# Altium footprint library Package_DFN_QFN.PcbLib: 557 footprints (part 10 of 35)
Each footprint in its own frame and in the unit in brackets; x right, y up, seen from the top. Pads: shape width x height; smd on the part's side, far side on the other; paste and mask are expansions set on the pad; w line width, h text height; cw(c..) or ccw(c..) is an arc to the next point about the centre after c.
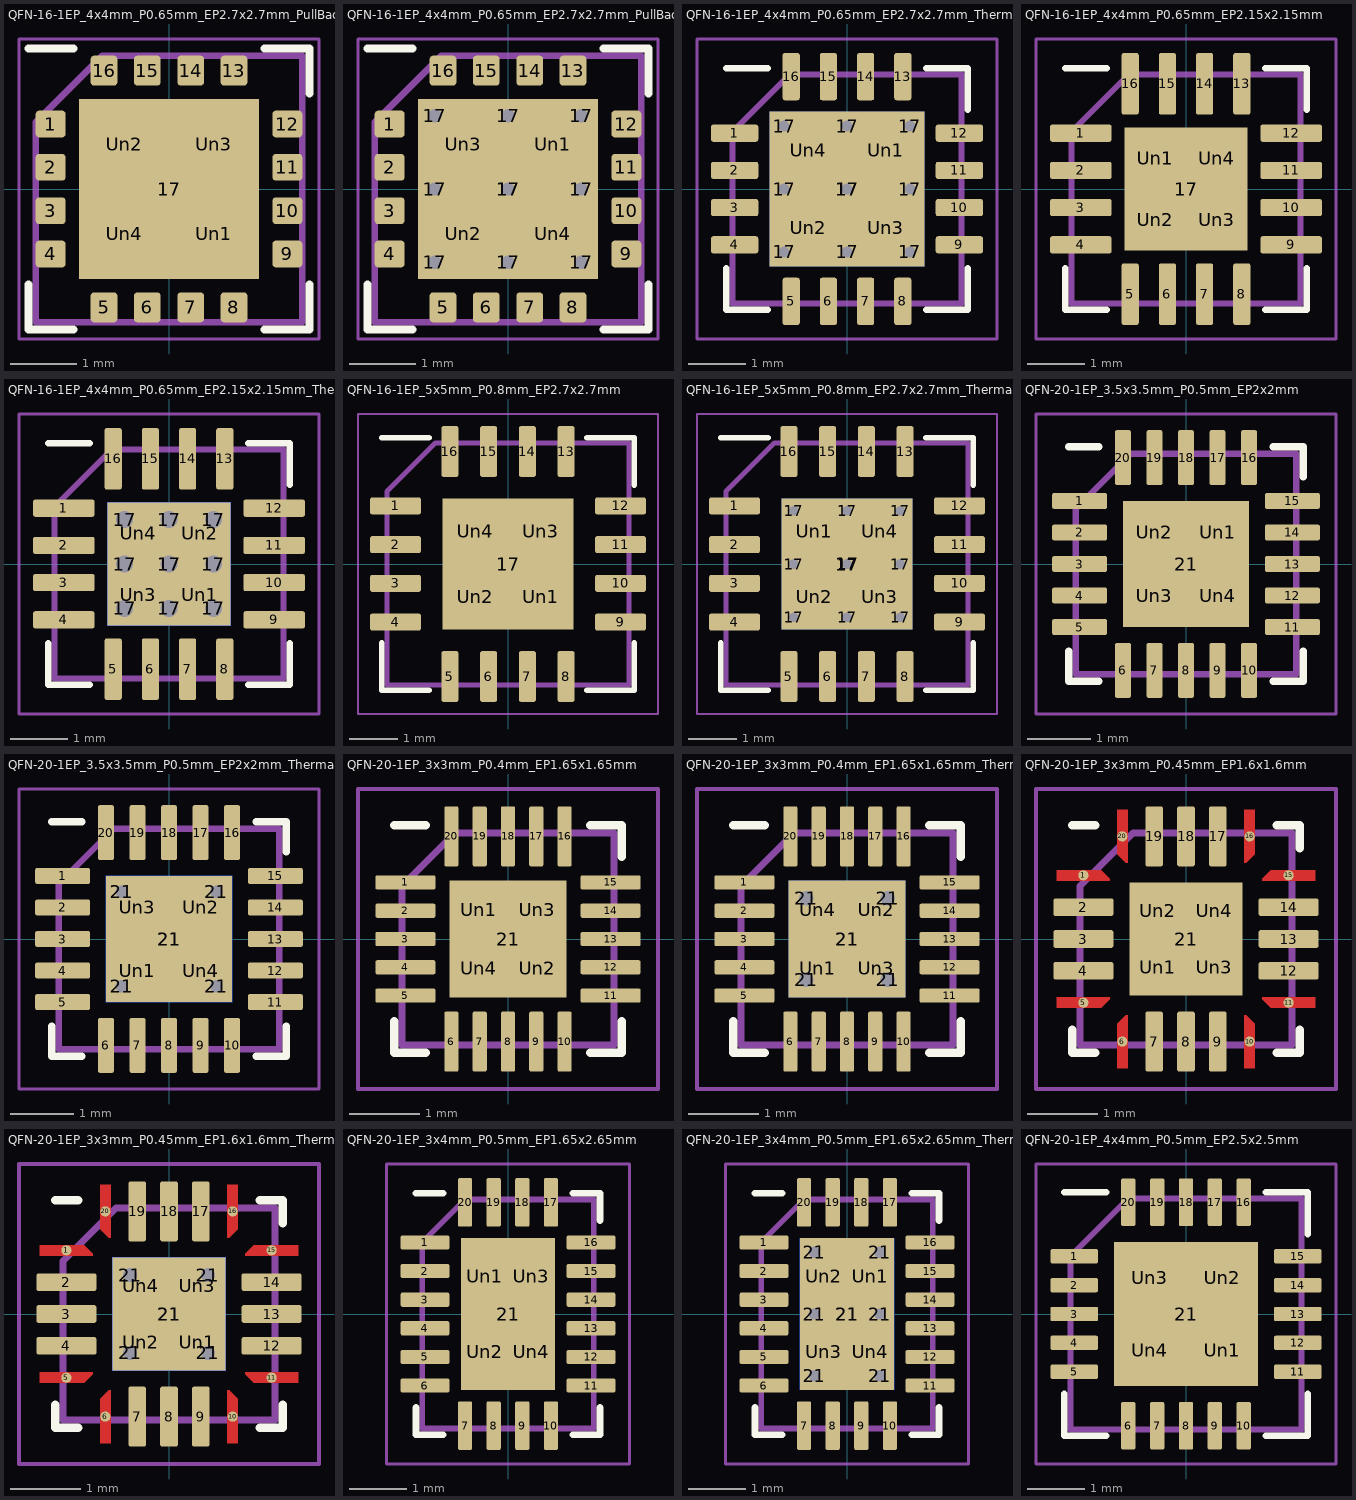
[diagram p9: the footprints below, top view; thin cyan lines are the x and y axes]

## QFN-16-1EP_4x4mm_P0.65mm_EP2.7x2.7mm_PullBack [mm]
pads (21):
  rrect25% 0.45x0.4 smd: 1(-1.775,0.975) 2(-1.775,0.325) 3(-1.775,-0.325) 4(-1.775,-0.975) 9(1.775,-0.975) 10(1.775,-0.325) 11(1.775,0.325) 12(1.775,0.975)
  rrect25% 0.4x0.45 smd: 5(-0.975,-1.775) 6(-0.325,-1.775) 7(0.325,-1.775) 8(0.975,-1.775) 13(0.975,1.775) 14(0.325,1.775) 15(-0.325,1.775) 16(-0.975,1.775)
  rect 2.7x2.7 smd: 17(0,0)
  rrect23% 1.09x1.09 on Top Paste: Un1(0.675,-0.675) Un2(-0.675,0.675) Un3(0.675,0.675) Un4(-0.675,-0.675)
F.SilkS:
  lines w0.12: -2.11,-1.435 -2.11,-2.11 -1.435,-2.11 ; -2.11,2.11 -1.435,2.11 ; 1.435,-2.11 2.11,-2.11 2.11,-1.435 ; 1.435,2.11 2.11,2.11 2.11,1.435
F.CrtYd:
  lines w0.05: -2.25,-2.25 2.25,-2.25 2.25,2.25 -2.25,2.25 -2.25,-2.25
F.Fab:
  lines w0.1: -2,-2 -2,1 -1,2 2,2 2,-2 -2,-2
  text "'.Designator'" at -4.047,-0.84 h1

## QFN-16-1EP_4x4mm_P0.65mm_EP2.7x2.7mm_PullBack_ThermalVias [mm]
pads (31):
  rrect25% 0.45x0.4 smd: 1(-1.775,0.975) 2(-1.775,0.325) 3(-1.775,-0.325) 4(-1.775,-0.975) 9(1.775,-0.975) 10(1.775,-0.325) 11(1.775,0.325) 12(1.775,0.975)
  rrect25% 0.4x0.45 smd: 5(-0.975,-1.775) 6(-0.325,-1.775) 7(0.325,-1.775) 8(0.975,-1.775) 13(0.975,1.775) 14(0.325,1.775) 15(-0.325,1.775) 16(-0.975,1.775)
  round 0.5 hole 0.2: 17(-1.1,-1.1) 17(-1.1,0) 17(-1.1,1.1) 17(0,-1.1) 17(0,0) 17(0,1.1) 17(1.1,-1.1) 17(1.1,0) 17(1.1,1.1)
  rect 2.7x2.7 smd far side: 17(0,0)
  rect 2.7x2.7 smd: 17(0,0)
  rrect21% 1.17x1.17 on Top Paste: Un1(0.675,0.675) Un2(-0.675,-0.675) Un3(-0.675,0.675) Un4(0.675,-0.675)
F.SilkS:
  lines w0.12: -2.11,-1.435 -2.11,-2.11 -1.435,-2.11 ; -2.11,2.11 -1.435,2.11 ; 1.435,-2.11 2.11,-2.11 2.11,-1.435 ; 1.435,2.11 2.11,2.11 2.11,1.435
F.CrtYd:
  lines w0.05: -2.25,-2.25 -2.25,2.25 2.25,2.25 2.25,-2.25 -2.25,-2.25
F.Fab:
  lines w0.1: -2,-2 2,-2 2,2 -1,2 -2,1 -2,-2
  text "'.Designator'" at -4.047,-0.84 h1

## QFN-16-1EP_4x4mm_P0.65mm_EP2.7x2.7mm_ThermalVias [mm]
pads (31):
  rrect25% 0.825x0.3 smd: 1(-1.963,0.975) 2(-1.963,0.325) 3(-1.963,-0.325) 4(-1.963,-0.975) 9(1.963,-0.975) 10(1.963,-0.325) 11(1.963,0.325) 12(1.963,0.975)
  rrect25% 0.3x0.825 smd: 5(-0.975,-1.963) 6(-0.325,-1.963) 7(0.325,-1.963) 8(0.975,-1.963) 13(0.975,1.963) 14(0.325,1.963) 15(-0.325,1.963) 16(-0.975,1.963)
  round 0.5 hole 0.2: 17(-1.1,-1.1) 17(-1.1,0) 17(-1.1,1.1) 17(0,-1.1) 17(0,0) 17(0,1.1) 17(1.1,-1.1) 17(1.1,0) 17(1.1,1.1)
  rect 2.7x2.7 smd: 17(0,0)
  rect 2.7x2.7 smd far side: 17(0,0)
  rrect21% 1.17x1.17 on Top Paste: Un1(0.675,0.675) Un2(-0.675,-0.675) Un3(0.675,-0.675) Un4(-0.675,0.675)
F.SilkS:
  lines w0.12: -2.11,-1.385 -2.11,-2.11 -1.385,-2.11 ; -2.11,2.11 -1.385,2.11 ; 1.385,-2.11 2.11,-2.11 2.11,-1.385 ; 1.385,2.11 2.11,2.11 2.11,1.385
F.CrtYd:
  lines w0.05: -2.62,-2.62 2.62,-2.62 2.62,2.62 -2.62,2.62 -2.62,-2.62
F.Fab:
  lines w0.1: -2,-2 2,-2 2,2 -1,2 -2,1 -2,-2
  text "'.Designator'" at -4.047,-0.84 h1

## QFN-16-1EP_4x4mm_P0.65mm_EP2.15x2.15mm [mm]
pads (21):
  rrect25% 1.075x0.3 smd: 1(-1.837,0.975) 2(-1.837,0.325) 3(-1.837,-0.325) 4(-1.837,-0.975) 9(1.837,-0.975) 10(1.837,-0.325) 11(1.837,0.325) 12(1.837,0.975)
  rrect25% 0.3x1.075 smd: 5(-0.975,-1.837) 6(-0.325,-1.837) 7(0.325,-1.837) 8(0.975,-1.837) 13(0.975,1.837) 14(0.325,1.837) 15(-0.325,1.837) 16(-0.975,1.837)
  rect 2.15x2.15 smd: 17(0,0)
  rrect25% 0.87x0.87 on Top Paste: Un1(-0.54,0.54) Un2(-0.54,-0.54) Un3(0.54,-0.54) Un4(0.54,0.54)
F.SilkS:
  lines w0.12: -2.11,-1.385 -2.11,-2.11 -1.385,-2.11 ; -2.11,2.11 -1.385,2.11 ; 1.385,-2.11 2.11,-2.11 2.11,-1.385 ; 1.385,2.11 2.11,2.11 2.11,1.385
F.CrtYd:
  lines w0.05: -2.62,-2.62 2.62,-2.62 2.62,2.62 -2.62,2.62 -2.62,-2.62
F.Fab:
  lines w0.1: -2,-2 2,-2 2,2 -1,2 -2,1 -2,-2
  text "'.Designator'" at -4.047,-0.84 h1

## QFN-16-1EP_4x4mm_P0.65mm_EP2.15x2.15mm_ThermalVias [mm]
pads (31):
  rrect25% 1.075x0.3 smd: 1(-1.837,0.975) 2(-1.837,0.325) 3(-1.837,-0.325) 4(-1.837,-0.975) 9(1.837,-0.975) 10(1.837,-0.325) 11(1.837,0.325) 12(1.837,0.975)
  rrect25% 0.3x1.075 smd: 5(-0.975,-1.837) 6(-0.325,-1.837) 7(0.325,-1.837) 8(0.975,-1.837) 13(0.975,1.837) 14(0.325,1.837) 15(-0.325,1.837) 16(-0.975,1.837)
  round 0.6 hole 0.3: 17(-0.775,-0.775) 17(-0.775,0) 17(-0.775,0.775) 17(0,-0.775) 17(0,0) 17(0,0.775) 17(0.775,-0.775) 17(0.775,0) 17(0.775,0.775)
  rect 2.15x2.15 smd far side: 17(0,0)
  rect 2.15x2.15 smd: 17(0,0)
  rrect25% 0.93x0.93 on Top Paste: Un1(0.54,-0.54) Un2(0.54,0.54) Un3(-0.54,-0.54) Un4(-0.54,0.54)
F.SilkS:
  lines w0.12: -2.11,-1.385 -2.11,-2.11 -1.385,-2.11 ; -2.11,2.11 -1.385,2.11 ; 1.385,-2.11 2.11,-2.11 2.11,-1.385 ; 1.385,2.11 2.11,2.11 2.11,1.385
F.CrtYd:
  lines w0.05: -2.62,-2.62 2.62,-2.62 2.62,2.62 -2.62,2.62 -2.62,-2.62
F.Fab:
  lines w0.1: -2,-2 -2,1 -1,2 2,2 2,-2 -2,-2
  text "'.Designator'" at -4.047,-0.84 h1

## QFN-16-1EP_5x5mm_P0.8mm_EP2.7x2.7mm [mm]
pads (21):
  rrect25% 1.05x0.35 smd: 1(-2.325,1.2) 2(-2.325,0.4) 3(-2.325,-0.4) 4(-2.325,-1.2) 9(2.325,-1.2) 10(2.325,-0.4) 11(2.325,0.4) 12(2.325,1.2)
  rrect25% 0.35x1.05 smd: 5(-1.2,-2.325) 6(-0.4,-2.325) 7(0.4,-2.325) 8(1.2,-2.325) 13(1.2,2.325) 14(0.4,2.325) 15(-0.4,2.325) 16(-1.2,2.325)
  rect 2.7x2.7 smd: 17(0,0)
  rrect23% 1.09x1.09 on Top Paste: Un1(0.675,-0.675) Un2(-0.675,-0.675) Un3(0.675,0.675) Un4(-0.675,0.675)
F.SilkS:
  lines w0.12: -2.61,-1.635 -2.61,-2.61 -1.635,-2.61 ; -2.61,2.61 -1.635,2.61 ; 1.635,-2.61 2.61,-2.61 2.61,-1.635 ; 1.635,2.61 2.61,2.61 2.61,1.635
F.CrtYd:
  lines w0.05: -3.1,-3.1 3.1,-3.1 3.1,3.1 -3.1,3.1 -3.1,-3.1
F.Fab:
  lines w0.1: -2.5,-2.5 -2.5,1.5 -1.5,2.5 2.5,2.5 2.5,-2.5 -2.5,-2.5
  text "'.Designator'" at -4.047,-0.84 h1

## QFN-16-1EP_5x5mm_P0.8mm_EP2.7x2.7mm_ThermalVias [mm]
pads (31):
  rrect25% 1.05x0.35 smd: 1(-2.325,1.2) 2(-2.325,0.4) 3(-2.325,-0.4) 4(-2.325,-1.2) 9(2.325,-1.2) 10(2.325,-0.4) 11(2.325,0.4) 12(2.325,1.2)
  rrect25% 0.35x1.05 smd: 5(-1.2,-2.325) 6(-0.4,-2.325) 7(0.4,-2.325) 8(1.2,-2.325) 13(1.2,2.325) 14(0.4,2.325) 15(-0.4,2.325) 16(-1.2,2.325)
  round 0.5 hole 0.2: 17(-1.1,-1.1) 17(-1.1,0) 17(-1.1,1.1) 17(0,-1.1) 17(0,0) 17(0,1.1) 17(1.1,-1.1) 17(1.1,0) 17(1.1,1.1)
  rect 2.7x2.7 smd: 17(0,0)
  rect 2.7x2.7 smd far side: 17(0,0)
  rrect21% 1.17x1.17 on Top Paste: Un1(-0.675,0.675) Un2(-0.675,-0.675) Un3(0.675,-0.675) Un4(0.675,0.675)
F.SilkS:
  lines w0.12: -2.61,-1.635 -2.61,-2.61 -1.635,-2.61 ; -2.61,2.61 -1.635,2.61 ; 1.635,-2.61 2.61,-2.61 2.61,-1.635 ; 1.635,2.61 2.61,2.61 2.61,1.635
F.CrtYd:
  lines w0.05: -3.1,-3.1 3.1,-3.1 3.1,3.1 -3.1,3.1 -3.1,-3.1
F.Fab:
  lines w0.1: -2.5,-2.5 -2.5,1.5 -1.5,2.5 2.5,2.5 2.5,-2.5 -2.5,-2.5
  text "'.Designator'" at -4.047,-0.84 h1

## QFN-20-1EP_3.5x3.5mm_P0.5mm_EP2x2mm [mm]
pads (25):
  rrect25% 0.875x0.25 smd: 1(-1.687,1) 2(-1.687,0.5) 3(-1.687,0) 4(-1.687,-0.5) 5(-1.687,-1) 11(1.687,-1) 12(1.687,-0.5) 13(1.687,0) 14(1.687,0.5) 15(1.687,1)
  rrect25% 0.25x0.875 smd: 6(-1,-1.687) 7(-0.5,-1.687) 8(0,-1.687) 9(0.5,-1.687) 10(1,-1.687) 16(1,1.687) 17(0.5,1.687) 18(0,1.687) 19(-0.5,1.687) 20(-1,1.687)
  rect 2x2 smd: 21(0,0)
  rrect25% 0.81x0.81 on Top Paste: Un1(0.5,0.5) Un2(-0.5,0.5) Un3(-0.5,-0.5) Un4(0.5,-0.5)
F.SilkS:
  lines w0.12: -1.86,-1.385 -1.86,-1.86 -1.385,-1.86 ; -1.86,1.86 -1.385,1.86 ; 1.385,-1.86 1.86,-1.86 1.86,-1.385 ; 1.385,1.86 1.86,1.86 1.86,1.385
F.CrtYd:
  lines w0.05: -2.38,-2.38 2.38,-2.38 2.38,2.38 -2.38,2.38 -2.38,-2.38
F.Fab:
  lines w0.1: -1.75,-1.75 -1.75,0.875 -0.875,1.75 1.75,1.75 1.75,-1.75 -1.75,-1.75
  text "'.Designator'" at -3.559,-0.737 h0.88

## QFN-20-1EP_3.5x3.5mm_P0.5mm_EP2x2mm_ThermalVias [mm]
pads (30):
  rrect25% 0.875x0.25 smd: 1(-1.687,1) 2(-1.687,0.5) 3(-1.687,0) 4(-1.687,-0.5) 5(-1.687,-1) 11(1.687,-1) 12(1.687,-0.5) 13(1.687,0) 14(1.687,0.5) 15(1.687,1)
  rrect25% 0.25x0.875 smd: 6(-1,-1.687) 7(-0.5,-1.687) 8(0,-1.687) 9(0.5,-1.687) 10(1,-1.687) 16(1,1.687) 17(0.5,1.687) 18(0,1.687) 19(-0.5,1.687) 20(-1,1.687)
  round 0.5 hole 0.2: 21(-0.75,-0.75) 21(-0.75,0.75) 21(0.75,-0.75) 21(0.75,0.75)
  rect 2x2 smd: 21(0,0)
  rect 2x2 smd far side: 21(0,0)
  rrect25% 0.87x0.87 on Top Paste: Un1(-0.5,-0.5) Un2(0.5,0.5) Un3(-0.5,0.5) Un4(0.5,-0.5)
F.SilkS:
  lines w0.12: -1.86,-1.385 -1.86,-1.86 -1.385,-1.86 ; -1.86,1.86 -1.385,1.86 ; 1.385,-1.86 1.86,-1.86 1.86,-1.385 ; 1.385,1.86 1.86,1.86 1.86,1.385
F.CrtYd:
  lines w0.05: -2.38,-2.38 -2.38,2.38 2.38,2.38 2.38,-2.38 -2.38,-2.38
F.Fab:
  lines w0.1: -1.75,-1.75 -1.75,0.875 -0.875,1.75 1.75,1.75 1.75,-1.75 -1.75,-1.75
  text "'.Designator'" at -3.559,-0.737 h0.88

## QFN-20-1EP_3x3mm_P0.4mm_EP1.65x1.65mm [mm]
pads (25):
  rrect25% 0.85x0.2 smd: 1(-1.45,0.8) 2(-1.45,0.4) 3(-1.45,0) 4(-1.45,-0.4) 5(-1.45,-0.8) 11(1.45,-0.8) 12(1.45,-0.4) 13(1.45,0) 14(1.45,0.4) 15(1.45,0.8)
  rrect25% 0.2x0.85 smd: 6(-0.8,-1.45) 7(-0.4,-1.45) 8(0,-1.45) 9(0.4,-1.45) 10(0.8,-1.45) 16(0.8,1.45) 17(0.4,1.45) 18(0,1.45) 19(-0.4,1.45) 20(-0.8,1.45)
  rect 1.65x1.65 smd: 21(0,0)
  rrect25% 0.67x0.67 on Top Paste: Un1(-0.41,0.41) Un2(0.41,-0.41) Un3(0.41,0.41) Un4(-0.41,-0.41)
F.SilkS:
  lines w0.12: -1.61,-1.16 -1.61,-1.61 -1.16,-1.61 ; -1.61,1.61 -1.16,1.61 ; 1.16,-1.61 1.61,-1.61 1.61,-1.16 ; 1.16,1.61 1.61,1.61 1.61,1.16
F.CrtYd:
  lines w0.05: -2.12,-2.12 -2.12,2.12 2.12,2.12 2.12,-2.12 -2.12,-2.12
F.Fab:
  lines w0.1: -1.5,-1.5 1.5,-1.5 1.5,1.5 -0.75,1.5 -1.5,0.75 -1.5,-1.5
  text "'.Designator'" at -3.033,-0.628 h0.75

## QFN-20-1EP_3x3mm_P0.4mm_EP1.65x1.65mm_ThermalVias [mm]
pads (30):
  rrect25% 0.85x0.2 smd: 1(-1.45,0.8) 2(-1.45,0.4) 3(-1.45,0) 4(-1.45,-0.4) 5(-1.45,-0.8) 11(1.45,-0.8) 12(1.45,-0.4) 13(1.45,0) 14(1.45,0.4) 15(1.45,0.8)
  rrect25% 0.2x0.85 smd: 6(-0.8,-1.45) 7(-0.4,-1.45) 8(0,-1.45) 9(0.4,-1.45) 10(0.8,-1.45) 16(0.8,1.45) 17(0.4,1.45) 18(0,1.45) 19(-0.4,1.45) 20(-0.8,1.45)
  round 0.5 hole 0.2: 21(-0.575,-0.575) 21(-0.575,0.575) 21(0.575,-0.575) 21(0.575,0.575)
  rect 1.65x1.65 smd: 21(0,0)
  rect 1.65x1.65 smd far side: 21(0,0)
  rrect25% 0.69x0.69 on Top Paste: Un1(-0.41,-0.41) Un2(0.41,0.41) Un3(0.41,-0.41) Un4(-0.41,0.41)
F.SilkS:
  lines w0.12: -1.61,-1.16 -1.61,-1.61 -1.16,-1.61 ; -1.61,1.61 -1.16,1.61 ; 1.16,-1.61 1.61,-1.61 1.61,-1.16 ; 1.16,1.61 1.61,1.61 1.61,1.16
F.CrtYd:
  lines w0.05: -2.12,-2.12 2.12,-2.12 2.12,2.12 -2.12,2.12 -2.12,-2.12
F.Fab:
  lines w0.1: -1.5,-1.5 -1.5,0.75 -0.75,1.5 1.5,1.5 1.5,-1.5 -1.5,-1.5
  text "'.Designator'" at -3.033,-0.628 h0.75

## QFN-20-1EP_3x3mm_P0.45mm_EP1.6x1.6mm [mm]
pads (25):
  round 0.144 smd: 1(-1.45,0.9) 5(-1.45,-0.9) 6(-0.9,-1.45) 10(0.9,-1.45) 11(1.45,-0.9) 15(1.45,0.9) 16(0.9,1.45) 20(-0.9,1.45)
  rrect25% 0.85x0.25 smd: 2(-1.45,0.45) 3(-1.45,0) 4(-1.45,-0.45) 12(1.45,-0.45) 13(1.45,0) 14(1.45,0.45)
  rrect25% 0.25x0.85 smd: 7(-0.45,-1.45) 8(0,-1.45) 9(0.45,-1.45) 17(0.45,1.45) 18(0,1.45) 19(-0.45,1.45)
  rect 1.6x1.6 smd: 21(0,0)
  rrect25% 0.64x0.64 on Top Paste: Un1(-0.4,-0.4) Un2(-0.4,0.4) Un3(0.4,-0.4) Un4(0.4,0.4)
F.Cu:
  region: -1.075,0.854 -1.075,0.825 -1.825,0.825 -1.825,0.975 -1.196,0.975
  region: -1.075,-0.854 -1.196,-0.975 -1.825,-0.975 -1.825,-0.825 -1.075,-0.825
  region: -0.825,-1.825 -0.975,-1.825 -0.975,-1.196 -0.854,-1.075 -0.825,-1.075
  region: 0.975,-1.196 0.975,-1.825 0.825,-1.825 0.825,-1.075 0.854,-1.075
  region: 1.825,-0.975 1.196,-0.975 1.075,-0.854 1.075,-0.825 1.825,-0.825
  region: 1.825,0.825 1.075,0.825 1.075,0.854 1.196,0.975 1.825,0.975
  region: 0.975,1.196 0.854,1.075 0.825,1.075 0.825,1.825 0.975,1.825
  region: -0.825,1.075 -0.854,1.075 -0.975,1.196 -0.975,1.825 -0.825,1.825
F.SilkS:
  lines w0.12: -1.61,-1.285 -1.61,-1.61 -1.285,-1.61 ; -1.61,1.61 -1.285,1.61 ; 1.285,-1.61 1.61,-1.61 1.61,-1.285 ; 1.285,1.61 1.61,1.61 1.61,1.285
F.Paste:
  region: -1.075,0.854 -1.075,0.825 -1.825,0.825 -1.825,0.975 -1.196,0.975
  region: -1.075,-0.854 -1.196,-0.975 -1.825,-0.975 -1.825,-0.825 -1.075,-0.825
  region: -0.825,-1.825 -0.975,-1.825 -0.975,-1.196 -0.854,-1.075 -0.825,-1.075
  region: 0.975,-1.196 0.975,-1.825 0.825,-1.825 0.825,-1.075 0.854,-1.075
  region: 1.825,-0.975 1.196,-0.975 1.075,-0.854 1.075,-0.825 1.825,-0.825
  region: 1.825,0.825 1.075,0.825 1.075,0.854 1.196,0.975 1.825,0.975
  region: 0.975,1.196 0.854,1.075 0.825,1.075 0.825,1.825 0.975,1.825
  region: -0.825,1.075 -0.854,1.075 -0.975,1.196 -0.975,1.825 -0.825,1.825
F.Mask:
  region: -1.075,0.854 -1.075,0.825 -1.825,0.825 -1.825,0.975 -1.196,0.975
  region: -1.075,-0.854 -1.196,-0.975 -1.825,-0.975 -1.825,-0.825 -1.075,-0.825
  region: -0.825,-1.825 -0.975,-1.825 -0.975,-1.196 -0.854,-1.075 -0.825,-1.075
  region: 0.975,-1.196 0.975,-1.825 0.825,-1.825 0.825,-1.075 0.854,-1.075
  region: 1.825,-0.975 1.196,-0.975 1.075,-0.854 1.075,-0.825 1.825,-0.825
  region: 1.825,0.825 1.075,0.825 1.075,0.854 1.196,0.975 1.825,0.975
  region: 0.975,1.196 0.854,1.075 0.825,1.075 0.825,1.825 0.975,1.825
  region: -0.825,1.075 -0.854,1.075 -0.975,1.196 -0.975,1.825 -0.825,1.825
F.CrtYd:
  lines w0.05: -2.12,-2.12 2.12,-2.12 2.12,2.12 -2.12,2.12 -2.12,-2.12
F.Fab:
  lines w0.1: -1.5,-1.5 1.5,-1.5 1.5,1.5 -0.75,1.5 -1.5,0.75 -1.5,-1.5
  text "'.Designator'" at -3.033,-0.628 h0.75

## QFN-20-1EP_3x3mm_P0.45mm_EP1.6x1.6mm_ThermalVias [mm]
pads (30):
  round 0.144 smd: 1(-1.45,0.9) 5(-1.45,-0.9) 6(-0.9,-1.45) 10(0.9,-1.45) 11(1.45,-0.9) 15(1.45,0.9) 16(0.9,1.45) 20(-0.9,1.45)
  rrect25% 0.85x0.25 smd: 2(-1.45,0.45) 3(-1.45,0) 4(-1.45,-0.45) 12(1.45,-0.45) 13(1.45,0) 14(1.45,0.45)
  rrect25% 0.25x0.85 smd: 7(-0.45,-1.45) 8(0,-1.45) 9(0.45,-1.45) 17(0.45,1.45) 18(0,1.45) 19(-0.45,1.45)
  round 0.5 hole 0.2: 21(-0.55,-0.55) 21(-0.55,0.55) 21(0.55,-0.55) 21(0.55,0.55)
  rect 1.6x1.6 smd far side: 21(0,0)
  rect 1.6x1.6 smd: 21(0,0)
  rrect25% 0.69x0.69 on Top Paste: Un1(0.4,-0.4) Un2(-0.4,-0.4) Un3(0.4,0.4) Un4(-0.4,0.4)
F.Cu:
  region: -1.075,0.854 -1.075,0.825 -1.825,0.825 -1.825,0.975 -1.196,0.975
  region: -1.075,-0.854 -1.196,-0.975 -1.825,-0.975 -1.825,-0.825 -1.075,-0.825
  region: -0.825,-1.825 -0.975,-1.825 -0.975,-1.196 -0.854,-1.075 -0.825,-1.075
  region: 0.975,-1.196 0.975,-1.825 0.825,-1.825 0.825,-1.075 0.854,-1.075
  region: 1.825,-0.975 1.196,-0.975 1.075,-0.854 1.075,-0.825 1.825,-0.825
  region: 1.825,0.825 1.075,0.825 1.075,0.854 1.196,0.975 1.825,0.975
  region: 0.975,1.196 0.854,1.075 0.825,1.075 0.825,1.825 0.975,1.825
  region: -0.825,1.075 -0.854,1.075 -0.975,1.196 -0.975,1.825 -0.825,1.825
F.SilkS:
  lines w0.12: -1.61,-1.285 -1.61,-1.61 -1.285,-1.61 ; -1.61,1.61 -1.285,1.61 ; 1.285,-1.61 1.61,-1.61 1.61,-1.285 ; 1.285,1.61 1.61,1.61 1.61,1.285
F.Paste:
  region: -1.075,0.854 -1.075,0.825 -1.825,0.825 -1.825,0.975 -1.196,0.975
  region: -1.075,-0.854 -1.196,-0.975 -1.825,-0.975 -1.825,-0.825 -1.075,-0.825
  region: -0.825,-1.825 -0.975,-1.825 -0.975,-1.196 -0.854,-1.075 -0.825,-1.075
  region: 0.975,-1.196 0.975,-1.825 0.825,-1.825 0.825,-1.075 0.854,-1.075
  region: 1.825,-0.975 1.196,-0.975 1.075,-0.854 1.075,-0.825 1.825,-0.825
  region: 1.825,0.825 1.075,0.825 1.075,0.854 1.196,0.975 1.825,0.975
  region: 0.975,1.196 0.854,1.075 0.825,1.075 0.825,1.825 0.975,1.825
  region: -0.825,1.075 -0.854,1.075 -0.975,1.196 -0.975,1.825 -0.825,1.825
F.Mask:
  region: -1.075,0.854 -1.075,0.825 -1.825,0.825 -1.825,0.975 -1.196,0.975
  region: -1.075,-0.854 -1.196,-0.975 -1.825,-0.975 -1.825,-0.825 -1.075,-0.825
  region: -0.825,-1.825 -0.975,-1.825 -0.975,-1.196 -0.854,-1.075 -0.825,-1.075
  region: 0.975,-1.196 0.975,-1.825 0.825,-1.825 0.825,-1.075 0.854,-1.075
  region: 1.825,-0.975 1.196,-0.975 1.075,-0.854 1.075,-0.825 1.825,-0.825
  region: 1.825,0.825 1.075,0.825 1.075,0.854 1.196,0.975 1.825,0.975
  region: 0.975,1.196 0.854,1.075 0.825,1.075 0.825,1.825 0.975,1.825
  region: -0.825,1.075 -0.854,1.075 -0.975,1.196 -0.975,1.825 -0.825,1.825
F.CrtYd:
  lines w0.05: -2.12,-2.12 2.12,-2.12 2.12,2.12 -2.12,2.12 -2.12,-2.12
F.Fab:
  lines w0.1: -1.5,-1.5 1.5,-1.5 1.5,1.5 -0.75,1.5 -1.5,0.75 -1.5,-1.5
  text "'.Designator'" at -3.033,-0.628 h0.75

## QFN-20-1EP_3x4mm_P0.5mm_EP1.65x2.65mm [mm]
pads (25):
  rrect25% 0.85x0.25 smd: 1(-1.45,1.25) 2(-1.45,0.75) 3(-1.45,0.25) 4(-1.45,-0.25) 5(-1.45,-0.75) 6(-1.45,-1.25) 11(1.45,-1.25) 12(1.45,-0.75) 13(1.45,-0.25) 14(1.45,0.25) 15(1.45,0.75) 16(1.45,1.25)
  rrect25% 0.25x0.85 smd: 7(-0.75,-1.95) 8(-0.25,-1.95) 9(0.25,-1.95) 10(0.75,-1.95) 17(0.75,1.95) 18(0.25,1.95) 19(-0.25,1.95) 20(-0.75,1.95)
  rect 1.65x2.65 smd: 21(0,0)
  rrect25% 0.67x1.07 on Top Paste: Un1(-0.41,0.66) Un2(-0.41,-0.66) Un3(0.41,0.66) Un4(0.41,-0.66)
F.SilkS:
  lines w0.12: -1.61,-1.635 -1.61,-2.11 -1.135,-2.11 ; -1.61,2.11 -1.135,2.11 ; 1.135,-2.11 1.61,-2.11 1.61,-1.635 ; 1.135,2.11 1.61,2.11 1.61,1.635
F.CrtYd:
  lines w0.05: -2.12,-2.62 2.12,-2.62 2.12,2.62 -2.12,2.62 -2.12,-2.62
F.Fab:
  lines w0.1: -1.5,-2 1.5,-2 1.5,2 -0.75,2 -1.5,1.25 -1.5,-2
  text "'.Designator'" at -3.033,-0.628 h0.75

## QFN-20-1EP_3x4mm_P0.5mm_EP1.65x2.65mm_ThermalVias [mm]
pads (32):
  rrect25% 0.85x0.25 smd: 1(-1.45,1.25) 2(-1.45,0.75) 3(-1.45,0.25) 4(-1.45,-0.25) 5(-1.45,-0.75) 6(-1.45,-1.25) 11(1.45,-1.25) 12(1.45,-0.75) 13(1.45,-0.25) 14(1.45,0.25) 15(1.45,0.75) 16(1.45,1.25)
  rrect25% 0.25x0.85 smd: 7(-0.75,-1.95) 8(-0.25,-1.95) 9(0.25,-1.95) 10(0.75,-1.95) 17(0.75,1.95) 18(0.25,1.95) 19(-0.25,1.95) 20(-0.75,1.95)
  round 0.5 hole 0.2: 21(-0.575,-1.075) 21(-0.575,0) 21(-0.575,1.075) 21(0.575,-1.075) 21(0.575,0) 21(0.575,1.075)
  rect 1.65x2.65 smd far side: 21(0,0)
  rect 1.65x2.65 smd: 21(0,0)
  rrect25% 0.71x1.15 on Top Paste: Un1(0.41,0.66) Un2(-0.41,0.66) Un3(-0.41,-0.66) Un4(0.41,-0.66)
F.SilkS:
  lines w0.12: -1.61,-1.635 -1.61,-2.11 -1.135,-2.11 ; -1.61,2.11 -1.135,2.11 ; 1.135,-2.11 1.61,-2.11 1.61,-1.635 ; 1.135,2.11 1.61,2.11 1.61,1.635
F.CrtYd:
  lines w0.05: -2.12,-2.62 -2.12,2.62 2.12,2.62 2.12,-2.62 -2.12,-2.62
F.Fab:
  lines w0.1: -1.5,-2 1.5,-2 1.5,2 -0.75,2 -1.5,1.25 -1.5,-2
  text "'.Designator'" at -3.033,-0.628 h0.75

## QFN-20-1EP_4x4mm_P0.5mm_EP2.5x2.5mm [mm]
pads (25):
  rrect25% 0.825x0.25 smd: 1(-1.937,1) 2(-1.937,0.5) 3(-1.937,0) 4(-1.937,-0.5) 5(-1.937,-1) 11(1.937,-1) 12(1.937,-0.5) 13(1.937,0) 14(1.937,0.5) 15(1.937,1)
  rrect25% 0.25x0.825 smd: 6(-1,-1.937) 7(-0.5,-1.937) 8(0,-1.937) 9(0.5,-1.937) 10(1,-1.937) 16(1,1.937) 17(0.5,1.937) 18(0,1.937) 19(-0.5,1.937) 20(-1,1.937)
  rect 2.5x2.5 smd: 21(0,0)
  rrect25% 1.01x1.01 on Top Paste: Un1(0.625,-0.625) Un2(0.625,0.625) Un3(-0.625,0.625) Un4(-0.625,-0.625)
F.SilkS:
  lines w0.12: -2.11,-1.385 -2.11,-2.11 -1.385,-2.11 ; -2.11,2.11 -1.385,2.11 ; 1.385,-2.11 2.11,-2.11 2.11,-1.385 ; 1.385,2.11 2.11,2.11 2.11,1.385
F.CrtYd:
  lines w0.05: -2.6,-2.6 2.6,-2.6 2.6,2.6 -2.6,2.6 -2.6,-2.6
F.Fab:
  lines w0.1: -2,-2 2,-2 2,2 -1,2 -2,1 -2,-2
  text "'.Designator'" at -4.047,-0.84 h1